# Altium footprint library pcb.PcbLib: 397 footprints (part 2 of 25)
Each footprint in its own frame and in the unit in brackets; x right, y up, seen from the top. Pads: shape width x height; smd on the part's side, far side on the other; paste and mask are expansions set on the pad; w line width, h text height; cw(c..) or ccw(c..) is an arc to the next point about the centre after c.
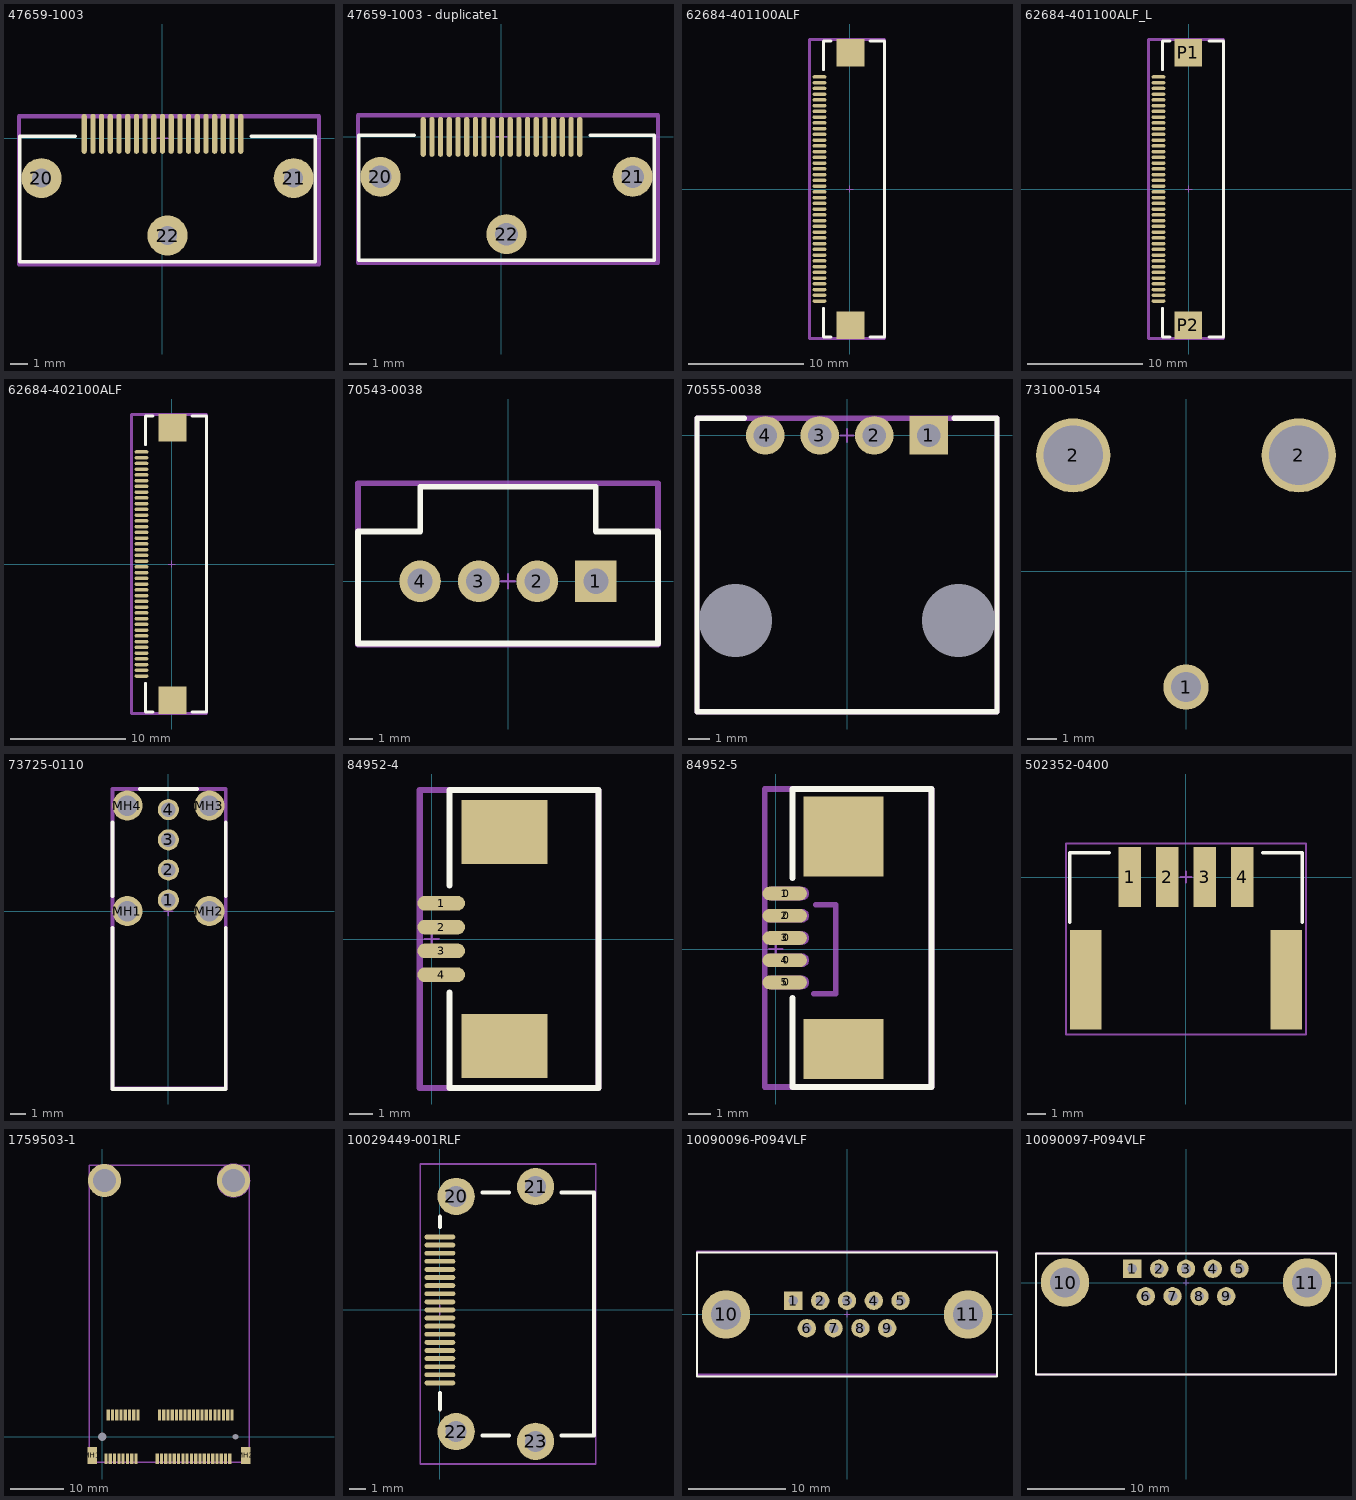
[diagram p1: the footprints below, top view; thin cyan lines are the x and y axes]

## 47659-1003 [mm]
height 8.5
pads (22):
  oval 0.3x2.3 smd: 1(4.5,0.25) 2(4,0.25) 3(3.5,0.25) 4(3,0.25) 5(2.5,0.25) 6(2,0.25) 7(1.5,0.25) 8(1,0.25) 9(0.5,0.25) 10(0,0.25) 11(-0.5,0.25) 12(-1,0.25) 13(-1.5,0.25) 14(-2,0.25) 15(-2.5,0.25) 16(-3,0.25) 17(-3.5,0.25) 18(-4,0.25) 19(-4.5,0.25)
  round 2.3 hole 1.1: 20(-6.96,-2.3) 21(7.54,-2.3) 22(0.29,-5.6)
Top Overlay:
  lines w0.2: -5.01,0.1 -8.21,0.1 -8.21,-7.1 8.79,-7.1 8.79,0.1 5.09,0.1
Mechanical 15:
  lines w0.1: -0.3,0 0.3,0 ; 0,-0.3 0,0.3
  lines w0.254: -8.25,-7.25 9,-7.25 9,1.25 -8.25,1.25 -8.25,-7.25
  text ".Designator" at -4.75,-0.5 h1.02
3D body "476591000.stp": height 8.5, standoff -3, extent -7.21,-7 7.79,0.545

## 47659-1003 - duplicate1 [mm]
height 8.5
pads (22):
  oval 0.3x2.3 smd: 1(4.5,0) 2(4,0) 3(3.5,0) 4(3,0) 5(2.5,0) 6(2,0) 7(1.5,0) 8(1,0) 9(0.5,0) 10(0,0) 11(-0.5,0) 12(-1,0) 13(-1.5,0) 14(-2,0) 15(-2.5,0) 16(-3,0) 17(-3.5,0) 18(-4,0) 19(-4.5,0)
  round 2.3 hole 1.3: 20(-6.96,-2.3) 21(7.54,-2.3) 22(0.29,-5.6)
Top Overlay:
  lines w0.2: -5.01,0.1 -8.21,0.1 -8.21,-7.1 8.79,-7.1 8.79,0.1 5.09,0.1
Mechanical 15:
  lines w0.1: -0.3,0 0.3,0 ; 0,-0.3 0,0.3
  lines w0.254: -8.25,-7.25 -8.25,1.25 9,1.25 9,-7.25 -8.25,-7.25
  text ".Designator" at -4,-0.5 h1.02
3D body "476591000.stp": height 8.5, standoff -3, extent -7.21,-7 7.79,0.545

## 62684-401100ALF [mm] "FPC/FFC  :  OPU Series, 40 Pos 0.5 mm (0.02 in.) Pitch FPC/FFC Connector, Side Entry, Upper Side Contact, SMT, ZIF"
height 2
pads (42):
  oval 1.2x0.3 smd: 1(-2.644,9.75) 2(-2.644,9.25) 3(-2.644,8.75) 4(-2.644,8.25) 5(-2.644,7.75) 6(-2.644,7.25) 7(-2.644,6.75) 8(-2.644,6.25) 9(-2.644,5.75) 10(-2.644,5.25) 11(-2.644,4.75) 12(-2.644,4.25) 13(-2.644,3.75) 14(-2.644,3.25) 15(-2.644,2.75) 16(-2.644,2.25) 17(-2.644,1.75) 18(-2.644,1.25) 19(-2.644,0.75) 20(-2.644,0.25) 21(-2.644,-0.25) 22(-2.644,-0.75) 23(-2.644,-1.25) 24(-2.644,-1.75) 25(-2.644,-2.25) 26(-2.644,-2.75) 27(-2.644,-3.25) 28(-2.644,-3.75) 29(-2.644,-4.25) 30(-2.644,-4.75) 31(-2.644,-5.25) 32(-2.644,-5.75) 33(-2.644,-6.25) 34(-2.644,-6.75) 35(-2.644,-7.25) 36(-2.644,-7.75) 37(-2.644,-8.25) 38(-2.644,-8.75) 39(-2.644,-9.25) 40(-2.644,-9.75)
  rect 2.4x2.4 smd: ""(0.056,-11.85) ""(0.056,11.85)
Top Overlay:
  lines w0.254: -2.3,-10.375 -2.3,-12.875 -1.625,-12.875 ; -2.3,10.375 -2.3,12.875 -1.625,12.875 ; 1.75,-12.875 3,-12.875 3,12.875 1.75,12.875
Mechanical 15:
  lines w0.1: -0.3,0 0.3,0 ; 0,-0.3 0,0.3
  lines w0.254: -3.5,-13 3,-13 3,13 -3.5,13 -3.5,-13
  text ".Designator" at 0,11.25 h1.02
3D body "s62684_401100alf.stp": height 2.01, standoff -0.05, extent -2.89,-12.75 2.75,12.75

## 62684-401100ALF_L [mm] "FPC/FFC  :  OPU Series, 40 Pos 0.5 mm (0.02 in.) Pitch FPC/FFC Connector, Side Entry, Lower Side Contact, SMT, ZIF"
height 2
pads (42):
  oval 1.2x0.3 smd: 1(-2.644,-9.75) 2(-2.644,-9.25) 3(-2.644,-8.75) 4(-2.644,-8.25) 5(-2.644,-7.75) 6(-2.644,-7.25) 7(-2.644,-6.75) 8(-2.644,-6.25) 9(-2.644,-5.75) 10(-2.644,-5.25) 11(-2.644,-4.75) 12(-2.644,-4.25) 13(-2.644,-3.75) 14(-2.644,-3.25) 15(-2.644,-2.75) 16(-2.644,-2.25) 17(-2.644,-1.75) 18(-2.644,-1.25) 19(-2.644,-0.75) 20(-2.644,-0.25) 21(-2.644,0.25) 22(-2.644,0.75) 23(-2.644,1.25) 24(-2.644,1.75) 25(-2.644,2.25) 26(-2.644,2.75) 27(-2.644,3.25) 28(-2.644,3.75) 29(-2.644,4.25) 30(-2.644,4.75) 31(-2.644,5.25) 32(-2.644,5.75) 33(-2.644,6.25) 34(-2.644,6.75) 35(-2.644,7.25) 36(-2.644,7.75) 37(-2.644,8.25) 38(-2.644,8.75) 39(-2.644,9.25) 40(-2.644,9.75)
  rect 2.4x2.4 smd: P1(-0.056,11.85) P2(-0.056,-11.85)
Top Overlay:
  lines w0.254: -2.3,-10.375 -2.3,-12.875 -1.625,-12.875 ; -2.3,10.375 -2.3,12.875 -1.625,12.875 ; 1.75,-12.875 3,-12.875 3,12.875 1.75,12.875
Mechanical 15:
  lines w0.1: -0.3,0 0.3,0 ; 0,-0.3 0,0.3
  lines w0.254: -3.5,-13 -3.5,13 3,13 3,-13 -3.5,-13
  text ".Designator" at 0,11.25 h1.02
3D body "s62684_401100alf.stp": height 2.01, standoff -0.05, extent -2.89,-12.75 2.75,12.75

## 62684-402100ALF [mm] "FPC/FFC  :  OPU Series, 40 Pos 0.5 mm (0.02 in.) Pitch FPC/FFC Connector, Side Entry, Upper Side Contact, SMT, ZIF"
height 2
pads (42):
  oval 1.2x0.3 smd: 1(-2.644,9.75) 2(-2.644,9.25) 3(-2.644,8.75) 4(-2.644,8.25) 5(-2.644,7.75) 6(-2.644,7.25) 7(-2.644,6.75) 8(-2.644,6.25) 9(-2.644,5.75) 10(-2.644,5.25) 11(-2.644,4.75) 12(-2.644,4.25) 13(-2.644,3.75) 14(-2.644,3.25) 15(-2.644,2.75) 16(-2.644,2.25) 17(-2.644,1.75) 18(-2.644,1.25) 19(-2.644,0.75) 20(-2.644,0.25) 21(-2.644,-0.25) 22(-2.644,-0.75) 23(-2.644,-1.25) 24(-2.644,-1.75) 25(-2.644,-2.25) 26(-2.644,-2.75) 27(-2.644,-3.25) 28(-2.644,-3.75) 29(-2.644,-4.25) 30(-2.644,-4.75) 31(-2.644,-5.25) 32(-2.644,-5.75) 33(-2.644,-6.25) 34(-2.644,-6.75) 35(-2.644,-7.25) 36(-2.644,-7.75) 37(-2.644,-8.25) 38(-2.644,-8.75) 39(-2.644,-9.25) 40(-2.644,-9.75)
  rect 2.4x2.4 smd: ""(0.056,-11.85) ""(0.056,11.85)
Top Overlay:
  lines w0.254: -2.3,-10.375 -2.3,-12.875 -1.625,-12.875 ; -2.3,10.375 -2.3,12.875 -1.625,12.875 ; 1.75,-12.875 3,-12.875 3,12.875 1.75,12.875
Mechanical 15:
  lines w0.1: -0.3,0 0.3,0 ; 0,-0.3 0,0.3
  lines w0.254: -3.5,-13 -3.5,13 3,13 3,-13 -3.5,-13
  text ".Designator" at 0,11.25 h1.02
3D body "62684402100alf.stp": height 2, standoff -0.05, extent -2.89,-12.75 2.71,12.75

## 70543-0038 [mm]
height 2.38
pads (4):
  rect 1.8x1.8 hole 1.09: 1(3.81,0)
  round 1.8 hole 1.09: 2(1.27,0) 3(-1.27,0) 4(-3.81,0)
Top Overlay:
  lines w0.254: -6.5,-2.7 -6.5,2.159 -3.8,2.159 -3.8,4.1 3.8,4.1 3.8,2.159 6.5,2.159 6.5,-2.7 -6.5,-2.7
Mechanical 15:
  lines w0.1: -0.3,0 0.3,0 ; 0,-0.3 0,0.3
  lines w0.254: -6.5,-2.75 6.5,-2.75 6.5,4.25 -6.5,4.25 -6.5,-2.75
  text ".Designator" at -3,2.5 h1.02
3D body "705430038.stp": height 11.71, standoff -3.4, extent -6.35,-2.6 6.35,4.004

## 70555-0038 [mm]
height 6
pads (6):
  rect 1.8x1.8 hole 1.09: 1(3.81,0)
  round 1.8 hole 1.09: 2(1.27,0) 3(-1.27,0) 4(-3.81,0)
  round 0 hole 3.4 unplated paste-1000 mask-1000: ""(-5.21,-8.64) ""(5.21,-8.64)
Top Overlay:
  lines w0.254: -4.8,0.8 -7,0.8 -7,-12.9 7,-12.9 7,0.8 5,0.8
Mechanical 15:
  lines w0.1: -0.3,0 0.3,0 ; 0,-0.3 0,0.3
  lines w0.254: -7,-12.9 7,-12.9 7,0.8 -7,0.8 -7,-12.9
  text ".Designator" at -5.3,-3.9 h1.02
3D body "705550038.stp": height 7.06, standoff -3.22, extent -7,-12.895 6.97,0.694

## 73100-0154 [mm] "RF Connectors / Coaxial Connectors 50 OHMS BNC PCB CONN 0 OHMS BNC PCB CONN.  RoHS Compliant By Exemption"
pads (3):
  round 1.524 hole 1: 1(0,-3.9)
  round 2.5 hole 2: 2(-3.8,3.9) 2(3.8,3.9)

## 73725-0110 [mm]
height 13.83
pads (8):
  round 1.4 hole 0.95: 1(0,0.73) 2(0,2.73) 3(0,4.73) 4(0,6.73)
  round 2 hole 1.35: MH1(-2.72,0) MH2(2.72,0) MH3(2.72,7) MH4(-2.72,7)
Top Overlay:
  lines w0.254: -3.7,-1.1 -3.7,-11.8 3.8,-11.8 3.8,-1.1 ; -3.7,1 -3.7,5.9 ; -1.9,8.1 1.9,8.1 ; 3.8,1 3.8,5.9
Mechanical 15:
  lines w0.1: -0.3,0 0.3,0 ; 0,-0.3 0,0.3
  lines w0.254: -3.7,-11.76 3.8,-11.76 3.8,8.1 -3.7,8.1 -3.7,-11.76
  text ".Designator" at -2.7,-2.4 h1.02
3D body "73725-0110blfc.stp": height 14.55, standoff -3.26, extent -3.52,-11.85 3.6,7.85

## 84952-4 [mm]
height 2.38
pads (6):
  oval 2x0.61 smd: 1(0.4,1.5) 2(0.4,0.5) 3(0.4,-0.5) 4(0.4,-1.5)
  rect 3.6x2.68 smd: ""(3.048,-4.49) ""(3.048,4.49)
Top Overlay:
  lines w0.254: 0.75,-2.25 0.75,-6.25 7,-6.25 7,6.25 0.75,6.25 0.75,2.25
Mechanical 15:
  lines w0.1: -0.3,0 0.3,0 ; 0,-0.3 0,0.3
  lines w0.254: -0.5,-6.25 7,-6.25 7,6.25 -0.5,6.25 -0.5,-6.25
  text ".Designator" at 4,-5 h1.02
3D body "c-84952-4-a-3d.stp": height 2.64, standoff 0.08, extent 0.2,-5.96 6.74,5.96

## 84952-5 [mm]
height 2.38
pads (12):
  oval 2x0.61 on Mech15: 0(0.5,-1.5) 0(0.5,-0.5) 0(0.5,0.5) 0(0.5,1.5) 0(0.5,2.5)
  oval 2x0.61 smd: 1(0.4,2.5) 2(0.4,1.5) 3(0.4,0.5) 4(0.4,-0.5) 5(0.4,-1.5)
  rect 3.6x2.68 smd: ""(3.048,-4.49)
  rect 3.6x3.6 smd: ""(3.048,5.07)
Top Overlay:
  lines w0.254: 0.75,-2.2 0.75,-6.2 7,-6.2 7,7.2 0.75,7.2 0.75,3.2
Mechanical 15:
  lines w0.1: -0.3,0 0.3,0 ; 0,-0.3 0,0.3
  lines w0.254: 1.7,-2 2.7,-2 2.7,2 1.8,2 ; -0.5,-6.2 7,-6.2 7,7.2 -0.5,7.2 -0.5,-6.2
  text ".Designator" at 6.2,-5.4 h1.02
  text "4POS" at 4,-1.8 h1
3D body "c-84952-5-a-3d.stp": height 2.64, standoff 0.08, extent 0.13,-5.9 6.67,7.03

## 502352-0400 [mm]
height 6.4
pads (6):
  rect 1.2x3.2 smd: 1(-3,0) 2(-1,0) 3(1,0) 4(3,0)
  rect 1.7x5.3 smd: ""(-5.35,-5.48) ""(5.35,-5.48)
Top Overlay:
  lines w0.2: -6.2,-2.4 -6.2,1.3 -4.1,1.3 ; 4.1,1.3 6.2,1.3 6.2,-2.4
Mechanical 15:
  lines w0.1: -0.3,0 0.3,0 ; 0,-0.3 0,0.3 ; -6.4,-8.4 6.4,-8.4 6.4,1.8 -6.4,1.8 -6.4,-8.4
  text ".Designator" at -5.5,-7.7 h1.02
  text "pcb_edge" at 7,-8.7 h1.02
3D body "5023520400.stp": height 6.46, standoff 0.06, extent -6,-8.3 6,1.1

## 1759503-1 [mm]
pads (58):
  rect 0.6x2 smd: 1(0.7,-4.1) 2(1.1,4.1) 3(1.5,-4.1) 4(1.9,4.1) 5(2.3,-4.1) 6(2.7,4.1) 7(3.1,-4.1) 8(3.5,4.1) 9(3.9,-4.1) 10(4.3,4.1) 11(4.7,-4.1) 12(5.1,4.1) 13(5.5,-4.1) 14(5.9,4.1) 15(6.3,-4.1) 16(6.7,4.1) 17(10.3,-4.1) 18(10.7,4.1) 19(11.1,-4.1) 20(11.5,4.1) 21(11.9,-4.1) 22(12.3,4.1) 23(12.7,-4.1) 24(13.1,4.1) 25(13.5,-4.1) 26(13.9,4.1) 27(14.3,-4.1) 28(14.7,4.1) 29(15.1,-4.1) 30(15.5,4.1) 31(15.9,-4.1) 32(16.3,4.1) 33(16.7,-4.1) 34(17.1,4.1) 35(17.5,-4.1) 36(17.9,4.1) 37(18.3,-4.1) 38(18.7,4.1) 39(19.1,-4.1) 40(19.5,4.1) 41(19.9,-4.1) 42(20.3,4.1) 43(20.7,-4.1) 44(21.1,4.1) 45(21.5,-4.1) 46(21.9,4.1) 47(22.3,-4.1) 48(22.7,4.1) 49(23.1,-4.1) 50(23.5,4.1) 51(23.9,-4.1) 52(24.3,4.1)
  rect 1.8x3.2 smd: MH1(-1.9,-3.5) MH2(26.9,-3.5)
  round 0 hole 1.6 unplated: ""(0,0)
  round 6.2 / inner round 0 / far side round 0 hole 4.3 unplated: ""(0.4,48.05) ""(24.6,48.05)
  round 0 hole 1.1 unplated: ""(25,0)
Top Paste:
  circle w0.6: c22.744,49.906 r0.175
  circle w0.6: c26.456,46.194 r0.175
  circle w0.6: c26.456,49.906 r0.175
  circle w0.6: c22.744,46.194 r0.175
  circle w0.6: c24.6,50.675 r0.175
  circle w0.6: c24.6,45.425 r0.175
  circle w0.6: c21.975,48.05 r0.175
  circle w0.6: c27.225,48.05 r0.175
  circle w0.6: c3.025,48.05 r0.175
  circle w0.6: c-2.225,48.05 r0.175
  circle w0.6: c0.4,45.425 r0.175
  circle w0.6: c0.4,50.675 r0.175
  circle w0.6: c-1.456,46.194 r0.175
  circle w0.6: c2.256,49.906 r0.175
  circle w0.6: c2.256,46.194 r0.175
  circle w0.6: c-1.456,49.906 r0.175
Mechanical 15:
  circle w0.2: c24.6,48.05 r3.1
  lines w0.1: -0.3,0 0.3,0 ; 0,-0.3 0,0.3
  lines w0.254: -2.5,-4.8 -2.5,50.9 27.5,50.9 27.5,-4.8 -2.5,-4.8
  text ".Designator" at -0.1,-2 h1.02
3D body: height 6, standoff 0, extent 21.82,45.281 27.358,50.83
3D body: height 6, standoff 0, extent -2.358,45.281 3.18,50.83
3D body "minicard.stp": height 8.95, standoff 4.2, extent -2.5,0 27.5,50.95
3D body "c-1759503-1-c-3d.stp": height 7.98, standoff -0.7, extent -2.5,-4.8 27.5,4.7

## 10029449-001RLF [mm]
height 2.38
pads (23):
  oval 1.9x0.3 smd: 1(0,4.5) 2(0,4) 3(0,3.5) 4(0,3) 5(0,2.5) 6(0,2) 7(0,1.5) 8(0,1) 9(0,0.5) 10(0,0) 11(0,-0.5) 12(0,-1) 13(0,-1.5) 14(0,-2) 15(0,-2.5) 16(0,-3) 17(0,-3.5) 18(0,-4) 19(0,-4.5)
  round 2.3 hole 1.3: 20(1,7) 21(5.9,7.6) 22(1,-7.5) 23(5.9,-8.1)
Top Overlay:
  lines w0.254: 0,-6.125 0,-5.125 ; 0,5.125 0,5.75 ; 2.625,-7.75 4.25,-7.75 ; 2.625,7.25 4.25,7.25 ; 7.5,-7.75 9.125,-7.75 9.5,-7.75 9.5,7.25 7.5,7.25
Mechanical 15:
  lines w0.1: -0.3,0 0.3,0 ; 0,-0.3 0,0.3 ; -1.2,-9.5 9.6,-9.5 9.6,9 -1.2,9 -1.2,-9.5
  text ".Designator" at 2.4,5.5 h1.02
3D body "472662201.stp": height 6.28, standoff -1.73, extent -0.25,-8.35 9.6,7.85

## 10090096-P094VLF [mm]
height 2.38
pads (11):
  rect 1.9x1.9 hole 1: 1(-5.54,1.42)
  round 1.9 hole 1: 2(-2.77,1.42) 3(0,1.42) 4(2.77,1.42) 5(5.54,1.42) 6(-4.155,-1.42) 7(-1.385,-1.42) 8(1.385,-1.42) 9(4.155,-1.42)
  round 5 hole 3.1: 10(-12.5,0) 11(12.5,0)
Top Overlay:
  lines w0.2: -15.5,-6.4 -15.5,6.4 15.5,6.4 15.5,-6.4 -15.5,-6.4
Mechanical 15:
  lines w0.1: -0.3,0 0.3,0 ; 0,-0.3 0,0.3
  lines w0.254: -15.5,-6.25 15.5,-6.25 15.5,6.5 -15.5,6.5 -15.5,-6.25
  text ".Designator" at -12,4.75 h1.02
3D body "c-1-1634222-2-f-3d.stp": height 13, standoff -4, extent -15.4,-6.25 15.4,6.3

## 10090097-P094VLF [mm] "D-SUB 9 Right angle"
height 12.55
pads (11):
  rect 1.9x1.9 hole 1: 1(-5.54,1.42)
  round 1.9 hole 1: 2(-2.77,1.42) 3(0,1.42) 4(2.77,1.42) 5(5.54,1.42) 6(-4.155,-1.42) 7(-1.385,-1.42) 8(1.385,-1.42) 9(4.155,-1.42)
  round 5 hole 3.1: 10(-12.5,0) 11(12.5,0)
Top Overlay:
  lines w0.2: -15.5,-9.5 15.5,-9.5 15.5,3 -15.5,3 -15.5,-9.5
Mechanical 15:
  lines w0.1: -0.3,0 0.3,0 ; 0,-0.3 0,0.3
  lines w0.254: -15.5,-9.5 -15.5,3 15.5,3 15.5,-9.5 -15.5,-9.5
  text ".Designator" at -8.9,-5.3 h1.02
  text "pcb_edge" at -3.8,-10.6 h1.02
3D body "10090097-P09.stp": height 12.52, standoff -3.8, extent -15.42,-15.4 15.42,2.9